# Altium footprint library LimeMicroAltiumLib_pcbLib.PcbLib: 281 footprints (part 12 of 18)
Each footprint in its own frame and in the unit in brackets; x right, y up, seen from the top. Pads: shape width x height; smd on the part's side, far side on the other; paste and mask are expansions set on the pad; w line width, h text height; cw(c..) or ccw(c..) is an arc to the next point about the centre after c.
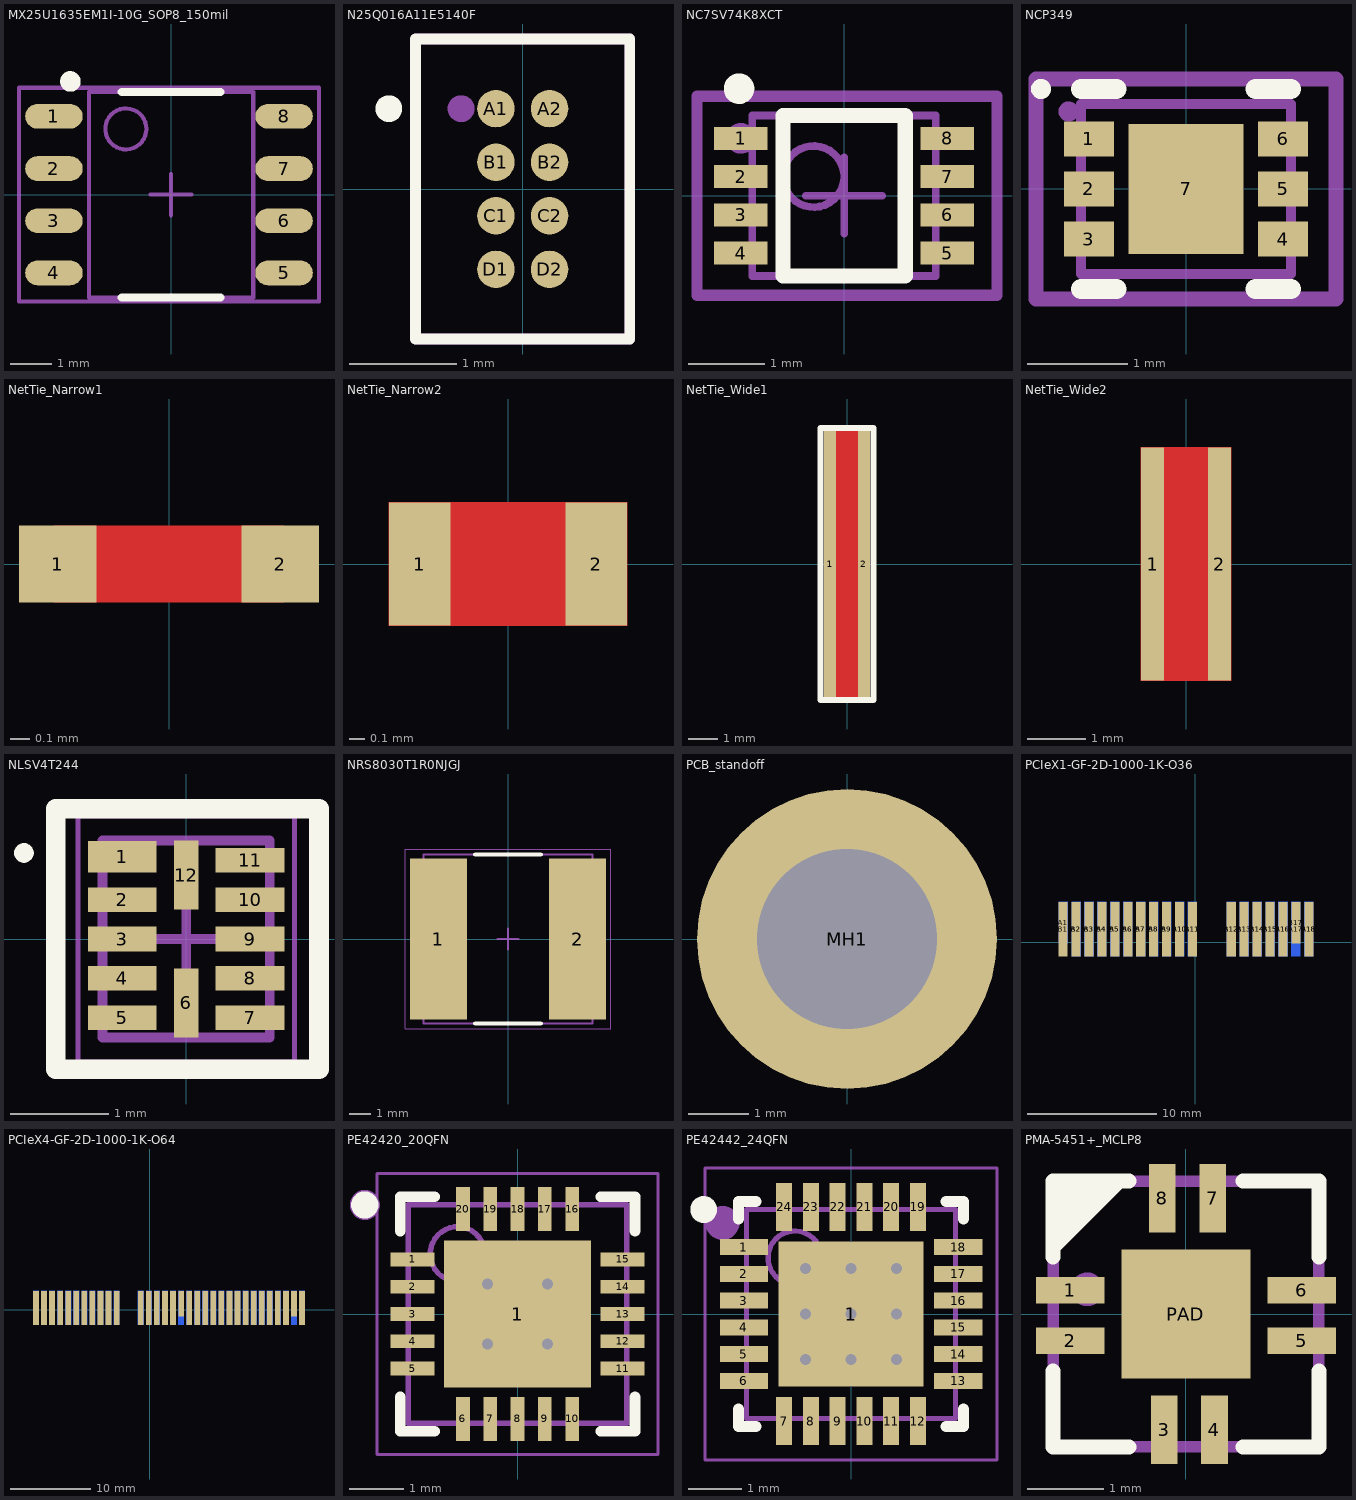
[diagram p11: the footprints below, top view; thin cyan lines are the x and y axes]

## MX25U1635EM1I-10G_SOP8_150mil [mm] "8-Pin Small Outline Integrated Circuit 1.27 mm Pitch"
height 1.55
pads (8):
  oval 1.4x0.6 smd: 1(-2.85,1.905) 2(-2.85,0.635) 3(-2.85,-0.635) 4(-2.85,-1.905) 5(2.75,-1.905) 6(2.75,-0.635) 7(2.75,0.635) 8(2.75,1.905)
Top Overlay:
  circle w0.25: c-2.45,2.755 r0.125
  lines w0.2: -1.2,-2.5 1.2,-2.5 ; -1.2,2.5 1.2,2.5
Mechanical 13:
  circle w0.1: c-1.1,1.6 r0.5
  lines w0.1: -2,-2.5 -2,2.5 2,2.5 2,-2.5 -2,-2.5
Mechanical 15:
  circle w0.35: c-3.1,1.9 r0.1
  lines w0.1: -0.5,0 0.5,0 ; 0,-0.5 0,0.5 ; -3.7,-2.6 -3.7,2.6 3.6,2.6 3.6,-2.6 -3.7,-2.6
  text ".Designator" at 0,0 h0.55
3D body "SOIC-8.STEP": height 1.75, standoff 0, extent -3,-2.45 3,2.45

## N25Q016A11E5140F [mm] "2.8 x 2 16 MB memory"
height 0.41
pads (8):
  round 0.35 smd mask+0.03: A1(-0.25,0.75) A2(0.25,0.75) B1(-0.25,0.25) B2(0.25,0.25) C1(-0.25,-0.25) C2(0.25,-0.25) D1(-0.25,-0.75) D2(0.25,-0.75)
Top Overlay:
  circle w0.2: c-1.25,0.75 r0.025
  lines w0.1: -1,-1.4 1,-1.4 1,1.4 -1,1.4 -1,-1.4
Mechanical 15:
  circle w0.2: c-0.575,0.75 r0.025
  lines w0.1: -1,-1.4 1,-1.4 1,1.4 -1,1.4 -1,-1.4
  text ".Designator" at 0,0 h0.55
3D body: height 0.41, standoff 0, extent -1,-1.4 1,1.4
3D body: height 0.42, standoff 0.41, extent -0.675,0.675 -0.275,1.075

## NC7SV74K8XCT [mm] "SOIC, 8-Leads, Body 2,00x2,30mm, Pitch 1,27mm, IPC Medium Density"
height 0.9
pads (8):
  rect 0.7x0.3 smd mask+0.05: 1(-1.35,0.75) 2(-1.35,0.25) 3(-1.35,-0.25) 4(-1.35,-0.75) 5(1.35,-0.75) 6(1.35,-0.25) 7(1.35,0.25) 8(1.35,0.75)
Top Overlay:
  circle w0.25: c-1.375,1.4 r0.075
  lines w0.2: -0.8,-1.05 0.8,-1.05 0.8,1.05 -0.8,1.05 -0.8,-1.05
Mechanical 13:
  circle w0.1: c-0.4,0.25 r0.4
  lines w0.1: -1.2,-1.05 1.2,-1.05 1.2,1.05 -1.2,1.05 -1.2,-1.05
Mechanical 15:
  circle w0.25: c-1.35,0.75 r0.075
  lines w0.1: -0.5,0 0.5,0 ; 0,-0.5 0,0.5
  lines w0.15: -1.925,-1.3 2,-1.3 2,1.3 -1.925,1.3 -1.925,-1.3
  text ".Designator" at 0,0.025 h0.7
3D body: height 0.9, standoff 0.1, extent -1.2,-1.05 1.2,1.05

## NCP349 [mm] "SON, 6-Leads, Body 1,60x2,00mm, Pitch 0,50mm, Thermal Pad 1,20x0,79mm, IPC Medium Density"
height 1
pads (7):
  rect 0.5x0.35 smd mask+0.05: 1(-0.97,0.5) 2(-0.97,0) 3(-0.97,-0.5) 4(0.97,-0.5) 5(0.97,0) 6(0.97,0.5)
  rect 1.15x1.3 smd mask+0.05: 7(0,0)
Top Overlay:
  circle w0.1: c-1.45,1 r0.05
  lines w0.2: -1.05,-1 -0.695,-1 ; -1.05,1 -0.695,1 ; 0.695,-1 1.05,-1 ; 0.695,1 1.05,1
Mechanical 13:
  lines w0.1: -1.05,-0.85 -1.05,0.85 1.05,0.85 1.05,-0.85 -1.05,-0.85
Mechanical 15:
  circle w0.1: c-1.175,0.775 r0.05
  lines w0.1: -0.5,0 0.5,0 ; 0,-0.5 0,0.5
  lines w0.15: -1.5,-1.1 -1.5,1.1 1.5,1.1 1.5,-1.1 -1.5,-1.1
  text ".Designator" at 0,0 h0.7
3D body: height 1, standoff 0.1, extent -1.05,-0.85 1.05,0.85

## NetTie_Narrow1 [mm]
pads (2):
  rect 0.4x0.4 smd: 1(-0.575,0) 2(0.575,0)
Top Layer:
  lines w0.4: -0.575,0 0.575,0

## NetTie_Narrow2 [mm]
pads (2):
  rect 0.4x0.8 smd: 1(-0.575,0) 2(0.575,0)
Top Layer:
  region: -0.775,0.4 -0.775,-0.4 0.775,-0.4 0.775,0.4

## NetTie_Wide1 [mm]
pads (2):
  rect 0.4x9 smd: 1(-0.575,0) 2(0.575,0)
Top Layer:
  region: -0.775,4.5 -0.775,-4.5 0.775,-4.5 0.775,4.5
Top Overlay:
  lines w0.2: -0.9,-4.6 -0.9,4.6 0.9,4.6 0.9,-4.6 -0.9,-4.6

## NetTie_Wide2 [mm]
pads (2):
  rect 0.4x4 smd: 1(-0.575,0) 2(0.575,0)
Top Layer:
  region: -0.775,2 -0.775,-2 0.775,-2 0.775,2

## NLSV4T244 [mm] "PQFN, 12-Leads, Body 1,70x2,00mm, Pitch 0,40mm, IPC Medium Density"
height 0.55
pads (12):
  rect 0.7x0.32 smd mask+0.05: 1(-0.65,0.835)
  rect 0.7x0.25 smd mask+0.05: 2(-0.65,0.4) 3(-0.65,0) 4(-0.65,-0.4) 5(-0.65,-0.8) 7(0.65,-0.8) 8(0.65,-0.4) 9(0.65,0) 10(0.65,0.4) 11(0.65,0.8)
  rect 0.25x0.7 smd mask+0.05: 6(0,-0.65) 12(0,0.65)
Top Overlay:
  circle w0.1: c-1.65,0.875 r0.05
  lines w0.2: -1.325,-1.325 -1.325,1.325 1.35,1.325 1.35,-1.325 -1.325,-1.325
Mechanical 13:
  lines w0.1: -0.85,-1 -0.85,1 0.85,1 0.85,-1 -0.85,-1
Mechanical 15:
  lines w0.05: -1.1,-1.25 -1.1,1.25 1.1,1.25 1.1,-1.25 -1.1,-1.25
  lines w0.1: -0.5,0 0.5,0 ; 0,-0.5 0,0.5
  text ".Designator" at 0,0 h0.7
3D body: height 0.55, standoff 0, extent -0.85,-1 0.85,1

## NRS8030T1R0NJGJ [mm] "Precision Wire Wound Inductor, 2-Leads, Body 8,00x8,00mm, IPC Medium Density"
height 3
pads (2):
  rect 2.7x7.6 smd: 1(-3.3,0) 2(3.3,0)
Top Overlay:
  lines w0.2: -1.55,-4 1.55,-4 ; -1.55,4 1.55,4
Mechanical 13:
  lines w0.1: -4,-4 -4,4 4,4 4,-4 -4,-4
Mechanical 15:
  lines w0.05: -4.875,-4.25 -4.875,4.25 4.875,4.25 4.875,-4.25 -4.875,-4.25
  lines w0.1: -0.5,0 0.5,0 ; 0,-0.5 0,0.5
  text ".Designator" at 0,0 h0.7
3D body: height 3, standoff 0, extent -4,-4 4,4

## PCB_standoff [mm]
pads (1):
  round 5 hole 3 unplated: MH1(0,0)
3D body "User Library-Male - Female Hexagonal Threaded Standoffs; length 15mm; key 5mm; M3x10mm and M3x6mm.step": height 5, standoff -16, extent -2.5,-2.887 2.5,2.887

## PCIeX1-GF-2D-1000-1K-O36 [mm]
pads (36):
  rect 0.7x3.2 smd far side paste-1: A1(-10.2,1.525)
  rect 0.7x4.2 smd far side paste-1: A2(-9.2,1.025) A3(-8.2,1.025) A4(-7.2,1.025) A5(-6.2,1.025) A6(-5.2,1.025) A7(-4.2,1.025) A8(-3.2,1.025) A9(-2.2,1.025) A10(-1.2,1.025) A11(-0.2,1.025) A12(2.8,1.025) A13(3.8,1.025) A14(4.8,1.025) A15(5.8,1.025) A16(6.8,1.025) A17(7.8,1.025) A18(8.8,1.025)
  rect 0.7x4.2 smd paste-1: B1(-10.2,1.025) B2(-9.2,1.025) B3(-8.2,1.025) B4(-7.2,1.025) B5(-6.2,1.025) B6(-5.2,1.025) B7(-4.2,1.025) B8(-3.2,1.025) B9(-2.2,1.025) B10(-1.2,1.025) B11(-0.2,1.025) B12(2.8,1.025) B13(3.8,1.025) B14(4.8,1.025) B15(5.8,1.025) B16(6.8,1.025) B18(8.8,1.025)
  rect 0.7x3.2 smd paste-1: B17(7.8,1.525)
Top Solder:
  rectangle: -11.1,-2.725 9.7,3.25
Bottom Solder:
  rectangle: -11.1,-2.725 9.7,3.25

## PCIeX4-GF-2D-1000-1K-O64 [mm]
pads (64):
  rect 0.7x3.2 smd far side: A1(-14.1,0.75)
  rect 0.7x4.2 smd far side: A2(-13.1,0.25) A3(-12.1,0.25) A4(-11.1,0.25) A5(-10.1,0.25) A6(-9.1,0.25) A7(-8.1,0.25) A8(-7.1,0.25) A9(-6.1,0.25) A10(-5.1,0.25) A11(-4.1,0.25) A12(-1.1,0.25) A13(-0.1,0.25) A14(0.9,0.25) A15(1.9,0.25) A16(2.9,0.25) A17(3.9,0.25) A18(4.9,0.25) A19(5.9,0.25) A20(6.9,0.25) A21(7.9,0.25) A22(8.9,0.25) A23(9.9,0.25) A24(10.9,0.25) A25(11.9,0.25) A26(12.9,0.25) A27(13.9,0.25) A28(14.9,0.25) A29(15.9,0.25) A30(16.9,0.25) A31(17.9,0.25) A32(18.9,0.25)
  rect 0.7x4.2 smd: B1(-14.1,0.25) B2(-13.1,0.25) B3(-12.1,0.25) B4(-11.1,0.25) B5(-10.1,0.25) B6(-9.1,0.25) B7(-8.1,0.25) B8(-7.1,0.25) B9(-6.1,0.25) B10(-5.1,0.25) B11(-4.1,0.25) B12(-1.1,0.25) B13(-0.1,0.25) B14(0.9,0.25) B15(1.9,0.25) B16(2.9,0.25) B18(4.9,0.25) B19(5.9,0.25) B20(6.9,0.25) B21(7.9,0.25) B22(8.9,0.25) B23(9.9,0.25) B24(10.9,0.25) B25(11.9,0.25) B26(12.9,0.25) B27(13.9,0.25) B28(14.9,0.25) B29(15.9,0.25) B30(16.9,0.25) B32(18.9,0.25)
  rect 0.7x3.2 smd: B17(3.9,0.75) B31(17.9,0.75)
Top Solder:
  rectangle: -15,-3.5 19.8,2.475
Bottom Solder:
  rectangle: -15,-3.5 19.8,2.475

## PE42420_20QFN [mm] "QFN, 20-Leads, Body 4,00x4,00mm, Pitch 0,50mm, Thermal Pad 2,70x2,70mm, IPC Medium Density"
height 0.8
pads (21):
  rect 0.8x0.25 smd mask+0.05: 1(-1.925,1) 2(-1.925,0.5) 3(-1.925,0) 4(-1.925,-0.5) 5(-1.925,-1) 11(1.925,-1) 12(1.925,-0.5) 13(1.925,0) 14(1.925,0.5) 15(1.925,1)
  rect 2.7x2.7 smd mask+0.05: 1(0,0)
  rect 0.25x0.8 smd mask+0.05: 6(-1,-1.925) 7(-0.5,-1.925) 8(0,-1.925) 9(0.5,-1.925) 10(1,-1.925) 16(1,1.925) 17(0.5,1.925) 18(0,1.925) 19(-0.5,1.925) 20(-1,1.925)
via -0.55,0.55 diameter 0.4 hole 0.2
via 0.55,0.55 diameter 0.4 hole 0.2
via -0.55,-0.55 diameter 0.4 hole 0.2
via 0.55,-0.55 diameter 0.4 hole 0.2
Top Overlay:
  circle w0.25: c-2.8,2 r0.125
  lines w0.2: -2.15,-1.525 -2.15,-2.15 -1.525,-2.15 ; -2.15,1.525 -2.15,2.15 -1.525,2.15 ; 1.525,-2.15 2.15,-2.15 2.15,-1.525 ; 1.525,2.15 2.15,2.15 2.15,1.525
Mechanical 13:
  circle w0.1: c-1.1,1.1 r0.5
  lines w0.1: -2,-2 -2,2 2,2 2,-2 -2,-2
Mechanical 15:
  circle w0.35: c-2.8,2 r0.1
  lines w0.05: -2.575,-2.575 -2.575,2.575 2.575,2.575 2.575,-2.575 -2.575,-2.575
  lines w0.1: -0.5,0 0.5,0 ; 0,-0.5 0,0.5
  text ".Designator" at 0,0 h0.7
3D body "User Library-QFN24-0_5.STEP": height 1, standoff 0, extent -2,-2 2,2

## PE42442_24QFN [mm] "QFN, 24-Leads, Body 4,00x4,00mm, Pitch 0,50mm, thermal pad, IPC Medium Density"
height 0.8
pads (25):
  rect 0.9x0.3 smd mask+0.05: 1(-2,1.25) 2(-2,0.75) 3(-2,0.25) 4(-2,-0.25) 5(-2,-0.75) 6(-2,-1.25) 13(2,-1.25) 14(2,-0.75) 15(2,-0.25) 16(2,0.25) 17(2,0.75) 18(2,1.25)
  rect 2.7x2.7 smd mask+0.05: 1(0,0)
  rect 0.3x0.9 smd mask+0.05: 7(-1.25,-2) 8(-0.75,-2) 9(-0.25,-2) 10(0.25,-2) 11(0.75,-2) 12(1.25,-2) 19(1.25,2) 20(0.75,2) 21(0.25,2) 22(-0.25,2) 23(-0.75,2) 24(-1.25,2)
via 0.85,0.85 diameter 0.5 hole 0.2
via -0.85,0.85 diameter 0.5 hole 0.2
via 0,0.85 diameter 0.5 hole 0.2
via 0,-0.85 diameter 0.5 hole 0.2
via 0.85,-0.85 diameter 0.5 hole 0.2
via -0.85,-0.85 diameter 0.5 hole 0.2
via -0.85,0 diameter 0.5 hole 0.2
via 0.85,0 diameter 0.5 hole 0.2
via 0,0 diameter 0.5 hole 0.2
Top Overlay:
  circle w0.25: c-2.75,1.95 r0.125
  lines w0.2: -2.1,-1.775 -2.1,-2.1 -1.775,-2.1 ; -2.1,1.775 -2.1,2.1 -1.775,2.1 ; 1.775,-2.1 2.1,-2.1 2.1,-1.775 ; 1.775,2.1 2.1,2.1 2.1,1.775
Mechanical 13:
  circle w0.1: c-1.05,1.05 r0.5
  lines w0.1: -1.95,-1.95 -1.95,1.95 1.95,1.95 1.95,-1.95 -1.95,-1.95
Mechanical 15:
  circle w0.35: c-2.4,1.7 r0.141
  lines w0.05: -2.725,-2.725 -2.725,2.725 2.725,2.725 2.725,-2.725 -2.725,-2.725
  lines w0.1: -0.5,0 0.5,0 ; 0,-0.5 0,0.5
  text ".Designator" at 0,0 h0.7
3D body "User Library-QFN24-0_5.STEP": height 1, standoff 0, extent -2,-2 2,2

## PMA-5451+_MCLP8 [mm]
pads (9):
  rect 0.9x0.35 smd mask+0.05: 1(-1.525,0.31) 2(-1.525,-0.35) 5(1.525,-0.35) 6(1.525,0.31)
  rect 0.35x0.9 smd mask+0.05: 3(-0.285,-1.525) 4(0.375,-1.525) 7(0.35,1.525) 8(-0.31,1.525)
  rect 1.7x1.7 smd mask+0.05: PAD(0,0)
Top Overlay:
  region: -1.75,0.75 -0.75,1.75 -1.75,1.75
  lines w0.2: -1.75,-0.75 -1.75,-1.75 -0.75,-1.75 ; -1.75,0.75 -1.75,1.75 -0.75,1.75 ; 0.75,-1.75 1.75,-1.75 1.75,-0.75 ; 0.75,1.75 1.75,1.75 1.75,0.75
Mechanical 15:
  circle w0.3: c-1.3,0.325 r0.071
  lines w0.15: -1.75,-1.75 1.75,-1.75 1.75,1.75 -1.75,1.75 -1.75,-1.75
  lines w0.2: -0.5,0 0,0 ; 0,-0.5 0,0 ; 0,0.5 0,0 ; 0.5,0 0,0
  text ".Designator" at 0,0 h0.55
3D body: height 0.95, standoff 0.9, extent -1.198,0.801 -0.8,1.2
3D body: height 0.9, standoff 0, extent -1.5,-1.5 1.5,1.5